# Altium footprint library Design III PCB Library.PcbLib: 89 footprints (part 2 of 6)
Each footprint in its own frame and in the unit in brackets; x right, y up, seen from the top. Pads: shape width x height; smd on the part's side, far side on the other; paste and mask are expansions set on the pad; w line width, h text height; cw(c..) or ccw(c..) is an arc to the next point about the centre after c.
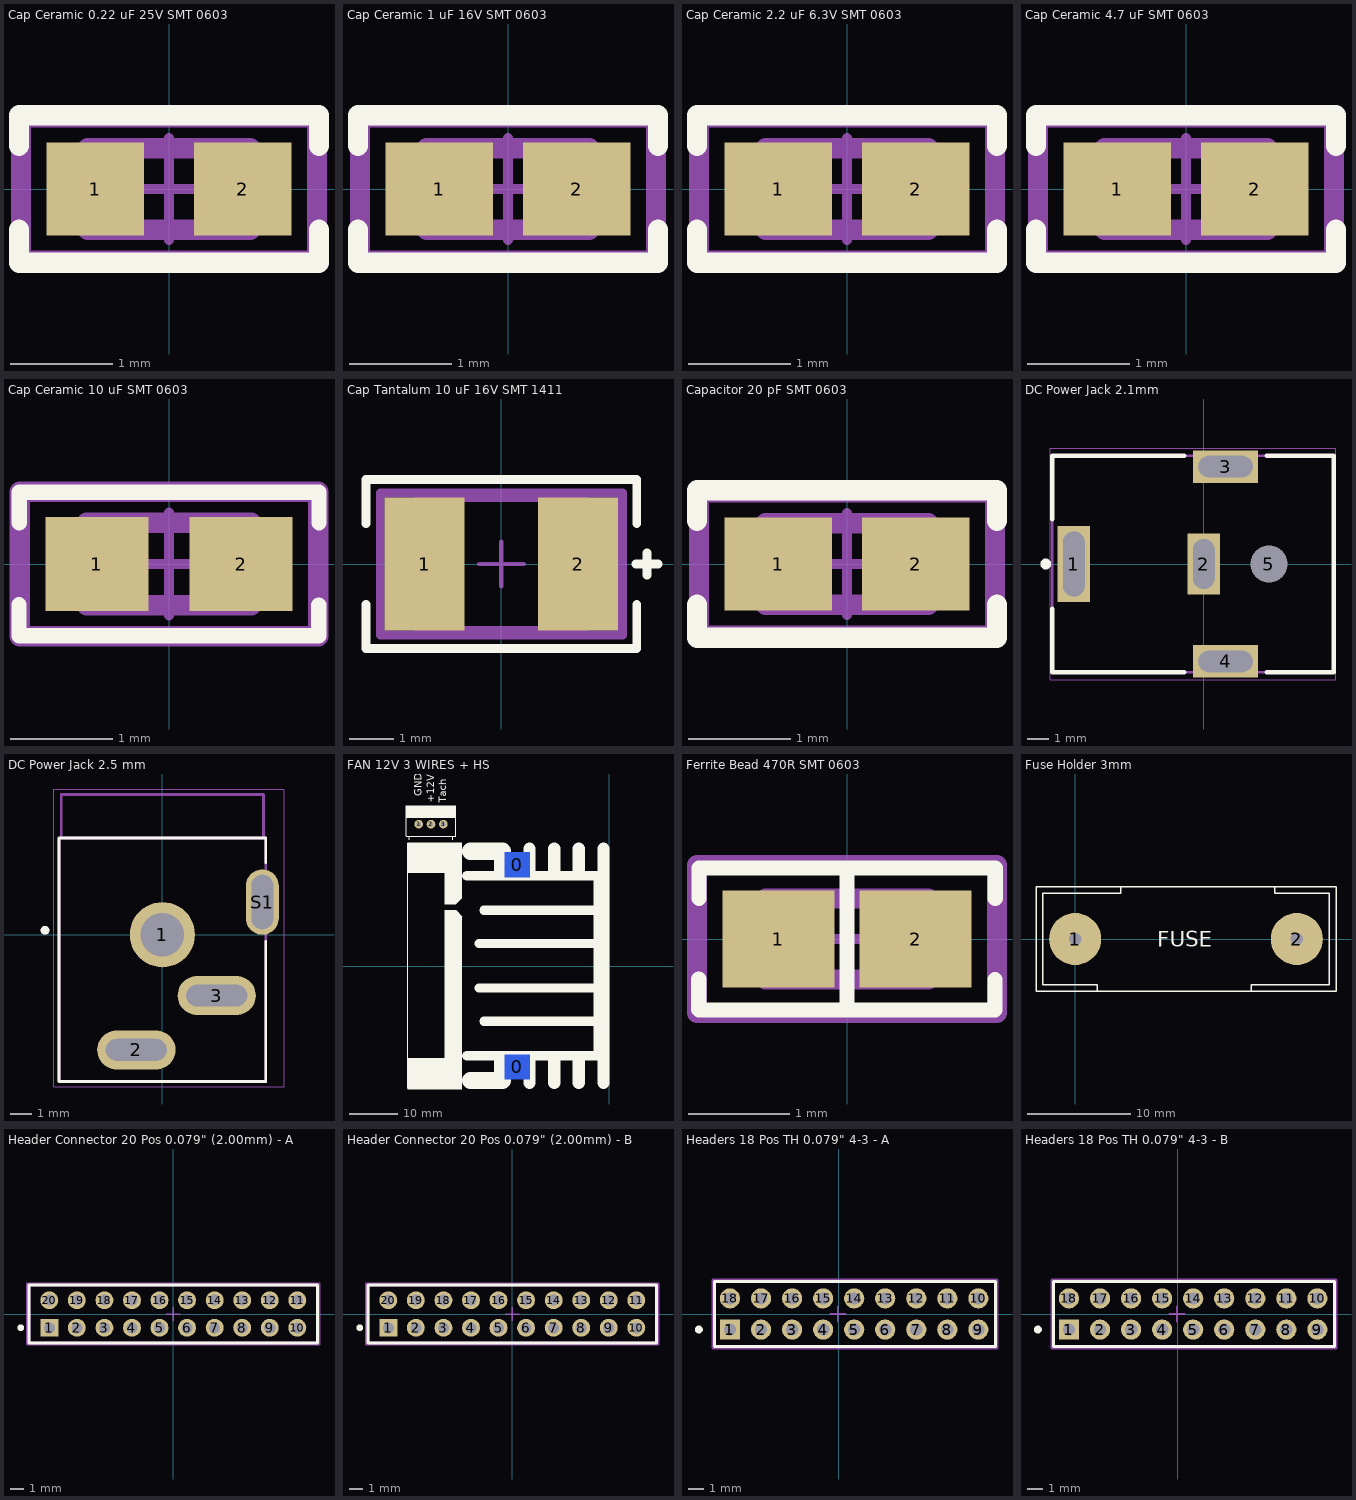
[diagram p1: the footprints below, top view; thin cyan lines are the x and y axes]

## Cap Ceramic 0.22 uF 25V SMT 0603 [mm] "0.22 µF ±10% 25V Ceramic Capacitor X7R 0603 (1608 Metric)"
pads (2):
  rect 0.959x0.912 smd paste+0 mask+0: 1(-0.727,0) 2(0.727,0)
Top Overlay:
  lines w0.2: -1.475,-0.4 -1.475,-0.725 1.475,-0.725 1.475,-0.4 ; -1.475,0.425 -1.475,0.725 1.475,0.725 1.475,0.425
Top Assembly:
  lines w0.2: -1.456,-0.706 1.456,-0.706 1.456,0.706 -1.456,0.706 -1.456,-0.706
Top Courtyard:
  lines w0.2: -1.456,-0.706 -1.456,0.706 1.456,0.706 1.456,-0.706 -1.456,-0.706
Board:
  lines w0.2: -0.8,-0.4 -0.8,0.4 0.8,0.4 0.8,-0.4 -0.8,-0.4
Top Component Center:
  lines w0.1: -0.5,0 0.5,0 ; 0,-0.5 0,0.5
3D body "Cap_Murata_GRM188R61E225KA12D_eec.STEP": height 0.25, standoff 0, extent -1.456,-0.706 1.456,0.706

## Cap Ceramic 1 uF 16V SMT 0603 [mm] "1 µF ±10% 16V Ceramic Capacitor X5R 0603 (1608 Metric)"
pads (2):
  rect 1.058x0.912 smd paste+0 mask+0: 1(-0.677,0) 2(0.677,0)
Top Overlay:
  lines w0.2: -1.475,-0.4 -1.475,-0.725 1.475,-0.725 1.475,-0.4 ; -1.475,0.425 -1.475,0.725 1.475,0.725 1.475,0.425
Top Assembly:
  lines w0.2: -1.456,-0.706 1.456,-0.706 1.456,0.706 -1.456,0.706 -1.456,-0.706
Top Courtyard:
  lines w0.2: -1.456,-0.706 1.456,-0.706 1.456,0.706 -1.456,0.706 -1.456,-0.706
Board:
  lines w0.2: -0.8,-0.4 0.8,-0.4 0.8,0.4 -0.8,0.4 -0.8,-0.4
Top Component Center:
  lines w0.1: -0.5,0 0.5,0 ; 0,-0.5 0,0.5
3D body "Cap_YAGEO_CC0603KRX7R9BB271_eec.STEP": height 0.25, standoff 0, extent -1.456,-0.706 1.456,0.706

## Cap Ceramic 2.2 uF 6.3V SMT 0603 [mm] "2.2 µF ±10% 6.3V Ceramic Capacitor X7R 0603 (1608 Metric)"
pads (2):
  rect 1.058x0.912 smd paste+0 mask+0: 1(-0.677,0) 2(0.677,0)
Top Overlay:
  lines w0.2: -1.475,-0.4 -1.475,-0.725 1.475,-0.725 1.475,-0.4 ; -1.475,0.425 -1.475,0.725 1.475,0.725 1.475,0.425
Mechanical 5:
  lines w0.2: -1.456,-0.706 -1.456,0.706 1.456,0.706 1.456,-0.706 -1.456,-0.706
Mechanical 13:
  lines w0.2: -0.8,-0.4 -0.8,0.4 0.8,0.4 0.8,-0.4 -0.8,-0.4
Mechanical 15:
  lines w0.2: -1.456,-0.706 -1.456,0.706 1.456,0.706 1.456,-0.706 -1.456,-0.706
Top Component Center:
  lines w0.1: -0.5,0 0.5,0 ; 0,-0.5 0,0.5
3D body "Cap_YAGEO_CC0603KRX7R9BB271_eec.STEP": height 0.25, standoff 0, extent -1.456,-0.706 1.456,0.706

## Cap Ceramic 4.7 uF SMT 0603 [mm] "4.7 µF ±10% 16V Ceramic Capacitor X5R 0603 (1608 Metric)"
pads (2):
  rect 1.058x0.912 smd paste+0 mask+0: 1(-0.677,0) 2(0.677,0)
Top Overlay:
  lines w0.2: -1.475,-0.4 -1.475,-0.725 1.475,-0.725 1.475,-0.4 ; -1.475,0.425 -1.475,0.725 1.475,0.725 1.475,0.425
Top Assembly:
  lines w0.2: -1.456,-0.706 -1.456,0.706 1.456,0.706 1.456,-0.706 -1.456,-0.706
Top Courtyard:
  lines w0.2: -1.456,-0.706 -1.456,0.706 1.456,0.706 1.456,-0.706 -1.456,-0.706
Board:
  lines w0.2: -0.8,-0.4 -0.8,0.4 0.8,0.4 0.8,-0.4 -0.8,-0.4
Top Component Center:
  lines w0.1: -0.5,0 0.5,0 ; 0,-0.5 0,0.5
3D body "Cap_YAGEO_CC0603KRX7R9BB271_eec.STEP": height 0.25, standoff 0, extent -1.456,-0.706 1.456,0.706

## Cap Ceramic 10 uF SMT 0603 [mm] "10 µF ±10% 6.3V Ceramic Capacitor X5R 0603 (1608 Metric)"
pads (2):
  rect 1.008x0.912 smd paste+0 mask+0: 1(-0.702,0) 2(0.702,0)
Top Overlay:
  lines w0.15: -1.462,-0.696 -1.462,-0.396 ; -1.459,-0.699 1.459,-0.699 1.459,-0.399 ; -1.459,0.401 -1.459,0.7 1.462,0.7 1.462,0.401
Top Assembly:
  lines w0.2: -1.456,-0.706 1.456,-0.706 1.456,0.706 -1.456,0.706 -1.456,-0.706
Top Courtyard:
  lines w0.2: -1.456,-0.706 1.456,-0.706 1.456,0.706 -1.456,0.706 -1.456,-0.706
Board:
  lines w0.2: -0.8,-0.4 0.8,-0.4 0.8,0.4 -0.8,0.4 -0.8,-0.4
Top Component Center:
  lines w0.1: -0.5,0 0.5,0 ; 0,-0.5 0,0.5
3D body "Cap_Murata_GRM188R60J106KE47D_eec.STEP": height 0.25, standoff 0, extent -1.456,-0.706 1.456,0.706

## Cap Tantalum 10 uF 16V SMT 1411 [mm] "10 µF Molded Tantalum Capacitors 16 V 1411 (3528 Metric) 2Ohm"
pads (2):
  rect 1.8x3 smd paste+0 mask+0: 1(-1.725,0) 2(1.725,0)
Top Overlay:
  lines w0.2: -3.048,-0.905 -3.048,-1.905 3.048,-1.905 3.048,-0.905 ; -3.048,0.905 -3.048,1.905 3.048,1.905 3.048,0.905 ; 3.025,0 3.525,0 ; 3.275,-0.25 3.275,0.25
Top Assembly:
  lines w0.2: -2.725,-1.6 -2.725,1.6 2.725,1.6 2.725,-1.6 -2.725,-1.6
Top 3D Body:
  lines w0.2: -1.85,-1.5 -1.85,1.5 1.85,1.5 1.85,-1.5 -1.85,-1.5
Top Courtyard:
  lines w0.2: -2.725,-1.6 -2.725,1.6 2.725,1.6 2.725,-1.6 -2.725,-1.6
Top Component Center:
  lines w0.1: -0.5,0 0.5,0 ; 0,-0.5 0,0.5
3D body "Cap_Vishay_293D106X9016B2TE3_eec.STEP": height 0.25, standoff 0, extent -2.725,-1.6 2.725,1.6

## Capacitor 20 pF SMT 0603 [mm]
pads (2):
  rect 1.058x0.912 smd paste+0 mask+0: 1(-0.677,0) 2(0.677,0)
Top Overlay:
  lines w0.2: -1.475,-0.4 -1.475,-0.725 1.475,-0.725 1.475,-0.4 ; -1.475,0.425 -1.475,0.725 1.475,0.725 1.475,0.425
Top Assembly:
  lines w0.2: -1.456,-0.706 1.456,-0.706 1.456,0.706 -1.456,0.706 -1.456,-0.706
Top Courtyard:
  lines w0.2: -1.456,-0.706 1.456,-0.706 1.456,0.706 -1.456,0.706 -1.456,-0.706
Board:
  lines w0.2: -0.8,-0.4 0.8,-0.4 0.8,0.4 -0.8,0.4 -0.8,-0.4
Top Component Center:
  lines w0.1: -0.5,0 0.5,0 -0.5,0 ; 0,-0.5 0,0.5 0,-0.5
3D body "Cap_Yageo_CC0603JRNPO9BN200_eec.STEP": height 0.25, standoff 0, extent -1.456,-0.706 1.456,0.706

## DC Power Jack 2.1mm [mm] "PJ-063AH"
pads (5):
  rect 1.5x3.5 hole 1 slot 3 at 90 deg: 1(-6,0)
  rect 1.5x2.8 hole 1 slot 2.3 at 90 deg: 2(0,0)
  rect 3x1.5 hole 1 slot 2.5 at 0 deg: 3(1,4.5) 4(1,-4.5)
  round 1.4 hole 1.7 unplated: 5(3,0)
Top Overlay:
  circle w0.25: c-7.3,0 r0.125
  lines w0.2: -7,-2.062 -7,-5 -0.9,-5 ; -7,2.062 -7,5 -0.9,5 ; 2.9,-5 6,-5 6,5 2.9,5
Mechanical 13:
  lines w0.1: -7,-5 6,-5 6,5 -7,5 -7,-5
Mechanical 15:
  lines w0.05: -7.1,-5.35 6.1,-5.35 6.1,5.35 -7.1,5.35 -7.1,-5.35
  lines w0.1: -0.5,0 0.5,0 ; 0,-0.5 0,0.5
3D body "pj-063ah.stp": height 9, standoff -3, extent -7,-5.15 6,5.15

## DC Power Jack 2.5 mm [mm] "Power Barrel Connector Jack 2.50mm ID (0.098\"), 5.50mm OD (0.217\") Through Hole"
pads (4):
  round 3 hole 2: 1(0,0)
  oval 3.6x1.8 hole 1 slot 2.8 at 0 deg: 2(-1.2,-5.3) 3(2.5,-2.8)
  oval 1.508x3.016 hole 1 slot 2.5 at 90 deg: S1(4.6,1.5)
Top Overlay:
  circle w0.2: c-5.4,0.2 r0.1
  lines w0.127: 4.75,-0.313 4.75,-6.75 -4.75,-6.75 -4.75,4.45 4.75,4.45 4.75,3.314
Mechanical 13:
  circle w0.2: c-5.4,0.2 r0.1
  lines w0.127: -4.65,4.45 -4.65,6.45 4.65,6.45 4.65,4.45 ; -4.75,-6.75 -4.75,4.45 4.75,4.45 4.75,-6.75 -4.75,-6.75
Mechanical 15:
  lines w0.05: -5,-7 -5,6.7 5.6,6.7 5.6,-7 -5,-7
3D body "CUI_DEVICES_PJ-090BH-2.step": height 14.2, standoff -1.8, extent -4.7,-6.7 4.8,4.5

## FAN 12V 3 WIRES + HS [mil]
pads (5):
  rect 200x200 smd far side: 0(-745.94,-818.28) 0(-745.94,821.72)
  round 70 hole 35.4: 1(-1545.94,1151.72) 2(-1445.94,1151.72) 3(-1345.94,1151.72)
Top Overlay:
  rectangle: -125.94,-748.28 4.06,751.72
  rectangle: -1645.94,1201.72 -1245.94,1301.72
  region: -1245.94,451.72 -1195.94,401.72 -1195.94,-998.28 -1635.94,-998.28 -1635.94,-748.28 -1335.94,-748.28 -1335.94,451.72
  region: -1195.94,1001.72 -1195.94,551.72 -1245.94,501.72 -1335.94,501.72 -1335.94,756.72 -1630.94,756.72 -1630.94,996.72 -1635.94,1001.72
  lines w10: -1635.94,-993.28 -1635.94,996.72 ; -1620.94,1026.72 -1620.94,1051.72 ; -1335.94,451.72 -1245.94,451.72 -1195.94,401.72 ; -1270.94,1026.72 -1270.94,1051.72 ; -1645.94,1051.72 -1245.94,1051.72 -1245.94,1301.72 -1645.94,1301.72 -1645.94,1051.72
  lines w75: -1155.94,-728.28 -95.94,-728.28 ; -1155.94,731.72 -95.94,731.72 ; -1055.94,-178.28 -95.94,-178.28 ; -1055.94,181.72 -95.94,181.72 ; -1015.94,-448.28 -95.94,-448.28 ; -1015.94,451.72 -95.94,451.72
  lines w100: -645.94,-948.28 -645.94,-748.28 ; -645.94,751.72 -645.94,951.72 ; -445.94,-948.28 -445.94,-748.28 ; -445.94,751.72 -445.94,951.72 ; -245.94,-948.28 -245.94,-748.28 ; -245.94,751.72 -245.94,951.72 ; -45.94,-948.28 -45.94,951.72
  lines w140: -1125.94,-928.28 -865.94,-928.28 -865.94,-768.28 ; -1125.94,931.72 -865.94,931.72 -865.94,771.72
  text "Tach" at -1320.94,1326.72 h60
  text "+12V" at -1420.94,1326.72 h60
  text "GND" at -1520.94,1376.72 h60

## Ferrite Bead 470R SMT 0603 [mm] "470 Ohms @ 100 MHz 1 Power Line Ferrite Bead 0603 (1608 Metric) 1A 200mOhm"
pads (2):
  rect 1.106x0.958 smd paste+0 mask+0: 1(-0.676,0) 2(0.676,0)
Top Overlay:
  lines w0.15: -1.462,-0.696 -1.462,-0.396 ; -1.459,-0.699 1.459,-0.699 1.459,-0.399 ; -1.459,0.401 -1.459,0.701 1.462,0.701 1.462,0.401 ; 0,-0.699 0,0.699
Top Assembly:
  lines w0.2: -1.479,-0.729 1.479,-0.729 1.479,0.729 -1.479,0.729 -1.479,-0.729
Top Courtyard:
  lines w0.2: -1.479,-0.729 1.479,-0.729 1.479,0.729 -1.479,0.729 -1.479,-0.729
Board:
  lines w0.2: -0.8,-0.4 0.8,-0.4 0.8,0.4 -0.8,0.4 -0.8,-0.4
Top Component Center:
  lines w0.1: -0.5,0 0.5,0 ; 0,-0.5 0,0.5
3D body "FBead_Murata_BLM18EG221SN1D_eec.STEP": height 0.25, standoff 0, extent -1.479,-0.729 1.479,0.729

## Fuse Holder 3mm [mm] "Fuse Holder 3mm"
pads (2):
  round 5.08 hole 1.199: 1(-0.029,0) 2(21.561,0)
Top Overlay:
  lines w0.127: 2.13,-5.08 2.13,-4.445 -3.204,-4.445 -3.204,4.445 4.416,4.445 4.416,5.08 ; 17.116,-5.08 17.116,-4.445 24.736,-4.445 24.736,4.445 19.402,4.445 19.402,5.08 ; -3.839,-5.08 25.371,-5.08 25.371,5.08 -3.839,5.08 -3.839,-5.08
  text "FUSE" at 7.972,-0.762 h1.52
3D body: height 2.92, standoff 0.13, extent -3.839,-5.08 25.371,5.08
3D body: height 10.16, standoff 2.92, extent -3.839,-5.08 4.416,5.08
3D body: height 10.16, standoff 2.92, extent 17.116,-5.08 25.371,5.08
3D body: height 0.13, standoff -4.95, extent -0.611,-0.583 0.555,0.584
3D body: height 0.13, standoff -4.95, extent 20.979,-0.583 22.145,0.584
3D body: height 9.53, standoff 2.92, extent 0.479,-4.318 1.241,-3.175
3D body: height 9.53, standoff 2.92, extent 0.479,3.175 1.241,4.318
3D body: height 2.95, standoff 2.92, extent -3.204,-4.318 1.241,4.318
3D body: height 2.95, standoff 2.92, extent 20.291,-4.318 24.736,4.318
3D body: height 9.53, standoff 2.92, extent 20.291,3.175 21.053,4.318
3D body: height 9.53, standoff 2.92, extent 20.291,-4.318 21.053,-3.175
3D body: height 4.44, standoff 2.92, extent 19.402,-3.175 20.037,3.175
3D body: height 4.44, standoff 2.92, extent 1.495,-3.175 2.13,3.175
3D body: height 3, standoff 2.92, extent 3.147,3.048 4.416,4.318
3D body: height 3, standoff 2.92, extent 3.147,-4.318 4.416,-3.048
3D body: height 3, standoff 2.92, extent 17.117,-4.318 18.386,-3.048
3D body: height 3, standoff 2.92, extent 17.117,3.048 18.386,4.318

## Header Connector 20 Pos 0.079" (2.00mm) - A [mm] "20 Position Header Connector 0.079\" (2.00mm) Through Hole Gold"
pads (20):
  rect 1.3x1.3 hole 0.8 paste-1000 mask+0: 1(-9,-1)
  round 1.3 hole 0.8 paste-1000 mask+0: 2(-7,-1) 3(-5,-1) 4(-3,-1) 5(-1,-1) 6(1,-1) 7(3,-1) 8(5,-1) 9(7,-1) 10(9,-1) 11(9,1) 12(7,1) 13(5,1) 14(3,1) 15(1,1) 16(-1,1) 17(-3,1) 18(-5,1) 19(-7,1) 20(-9,1)
Top Overlay:
  circle w0.25: c-11.075,-1 r0.125
  lines w0.2: -10.475,-2.1 10.475,-2.1 10.475,2.1 -10.475,2.1 -10.475,-2.1
Top Assembly:
  lines w0.2: -10.575,-2.2 -10.575,2.2 10.575,2.2 10.575,-2.2 -10.575,-2.2
Top Courtyard:
  lines w0.2: -10.575,-2.2 -10.575,2.2 10.575,2.2 10.575,-2.2 -10.575,-2.2
Board:
  lines w0.2: -10.475,-2.1 -10.475,2.1 10.475,2.1 10.475,-2.1 -10.475,-2.1
Top Component Center:
  lines w0.1: -0.5,0 0.5,0 ; 0,-0.5 0,0.5
3D body "Conn_Sullins_NPPN102AFCN-RC_eec.STEP": height 0.25, standoff 0, extent -10.575,-2.2 10.575,2.2

## Header Connector 20 Pos 0.079" (2.00mm) - B [mm]
pads (20):
  rect 1.3x1.3 hole 0.8 paste-1000 mask+0: 1(-9,-1)
  round 1.3 hole 0.8 paste-1000 mask+0: 2(-7,-1) 3(-5,-1) 4(-3,-1) 5(-1,-1) 6(1,-1) 7(3,-1) 8(5,-1) 9(7,-1) 10(9,-1) 11(9,1) 12(7,1) 13(5,1) 14(3,1) 15(1,1) 16(-1,1) 17(-3,1) 18(-5,1) 19(-7,1) 20(-9,1)
Top Overlay:
  circle w0.25: c-11.075,-1 r0.125
  lines w0.2: -10.475,-2.1 10.475,-2.1 10.475,2.1 -10.475,2.1 -10.475,-2.1
Top Assembly:
  lines w0.2: -10.575,-2.2 -10.575,2.2 10.575,2.2 10.575,-2.2 -10.575,-2.2
Top Courtyard:
  lines w0.2: -10.575,-2.2 -10.575,2.2 10.575,2.2 10.575,-2.2 -10.575,-2.2
Board:
  lines w0.2: -10.475,-2.1 -10.475,2.1 10.475,2.1 10.475,-2.1 -10.475,-2.1
Top Component Center:
  lines w0.1: -0.5,0 0.5,0 ; 0,-0.5 0,0.5

## Headers 18 Pos TH 0.079" 4-3 - A [mm] "Connector Header Through Hole 18 position 0.079\" (2.00mm)"
pads (18):
  rect 1.3x1.3 hole 0.8 paste-1000 mask+0: 1(-7,-1)
  round 1.3 hole 0.8 paste-1000 mask+0: 2(-5,-1) 3(-3,-1) 4(-1,-1) 5(1,-1) 6(3,-1) 7(5,-1) 8(7,-1) 9(9,-1) 10(9,1) 11(7,1) 12(5,1) 13(3,1) 14(1,1) 15(-1,1) 16(-3,1) 17(-5,1) 18(-7,1)
Top Overlay:
  circle w0.25: c-9,-1 r0.125
  lines w0.2: -8,-2.1 10.1,-2.1 10.1,2.1 -8,2.1 -8,-2.1
Top Assembly:
  lines w0.2: -8,-2.1 10.1,-2.1 10.1,2.1 -8,2.1 -8,-2.1
Top Courtyard:
  lines w0.2: -8.1,-2.2 -8.1,2.2 10.2,2.2 10.2,-2.2 -8.1,-2.2
Board:
  lines w0.2: -8,-2.1 -8,2.1 10.1,2.1 10.1,-2.1 -8,-2.1
Top Component Center:
  lines w0.1: -0.55,0 0.45,0 ; -0.05,-0.5 -0.05,0.5
3D body "BF050-18-A-B-0400-0300-L-G.stp": height 6, standoff -3, extent -8,-2 10,2

## Headers 18 Pos TH 0.079" 4-3 - B [mm] "Connector Header Through Hole 18 position 0.079\" (2.00mm)"
pads (18):
  rect 1.3x1.3 hole 0.8 paste-1000 mask+0: 1(-7,-1)
  round 1.3 hole 0.8 paste-1000 mask+0: 2(-5,-1) 3(-3,-1) 4(-1,-1) 5(1,-1) 6(3,-1) 7(5,-1) 8(7,-1) 9(9,-1) 10(9,1) 11(7,1) 12(5,1) 13(3,1) 14(1,1) 15(-1,1) 16(-3,1) 17(-5,1) 18(-7,1)
Top Overlay:
  circle w0.25: c-9,-1 r0.125
  lines w0.2: -8,-2.1 -8,2.1 10.1,2.1 10.1,-2.1 -8,-2.1
Top Assembly:
  lines w0.2: -8,-2.1 -8,2.1 10.1,2.1 10.1,-2.1 -8,-2.1
Top Courtyard:
  lines w0.2: -8.1,-2.2 10.2,-2.2 10.2,2.2 -8.1,2.2 -8.1,-2.2
Board:
  lines w0.2: -8,-2.1 10.1,-2.1 10.1,2.1 -8,2.1 -8,-2.1
Top Component Center:
  lines w0.1: -0.55,0 0.45,0 ; -0.05,-0.5 -0.05,0.5